# Altium footprint library MainFPs.PcbLib: 206 footprints (part 11 of 13)
Each footprint in its own frame and in the unit in brackets; x right, y up, seen from the top. Pads: shape width x height; smd on the part's side, far side on the other; paste and mask are expansions set on the pad; w line width, h text height; cw(c..) or ccw(c..) is an arc to the next point about the centre after c.
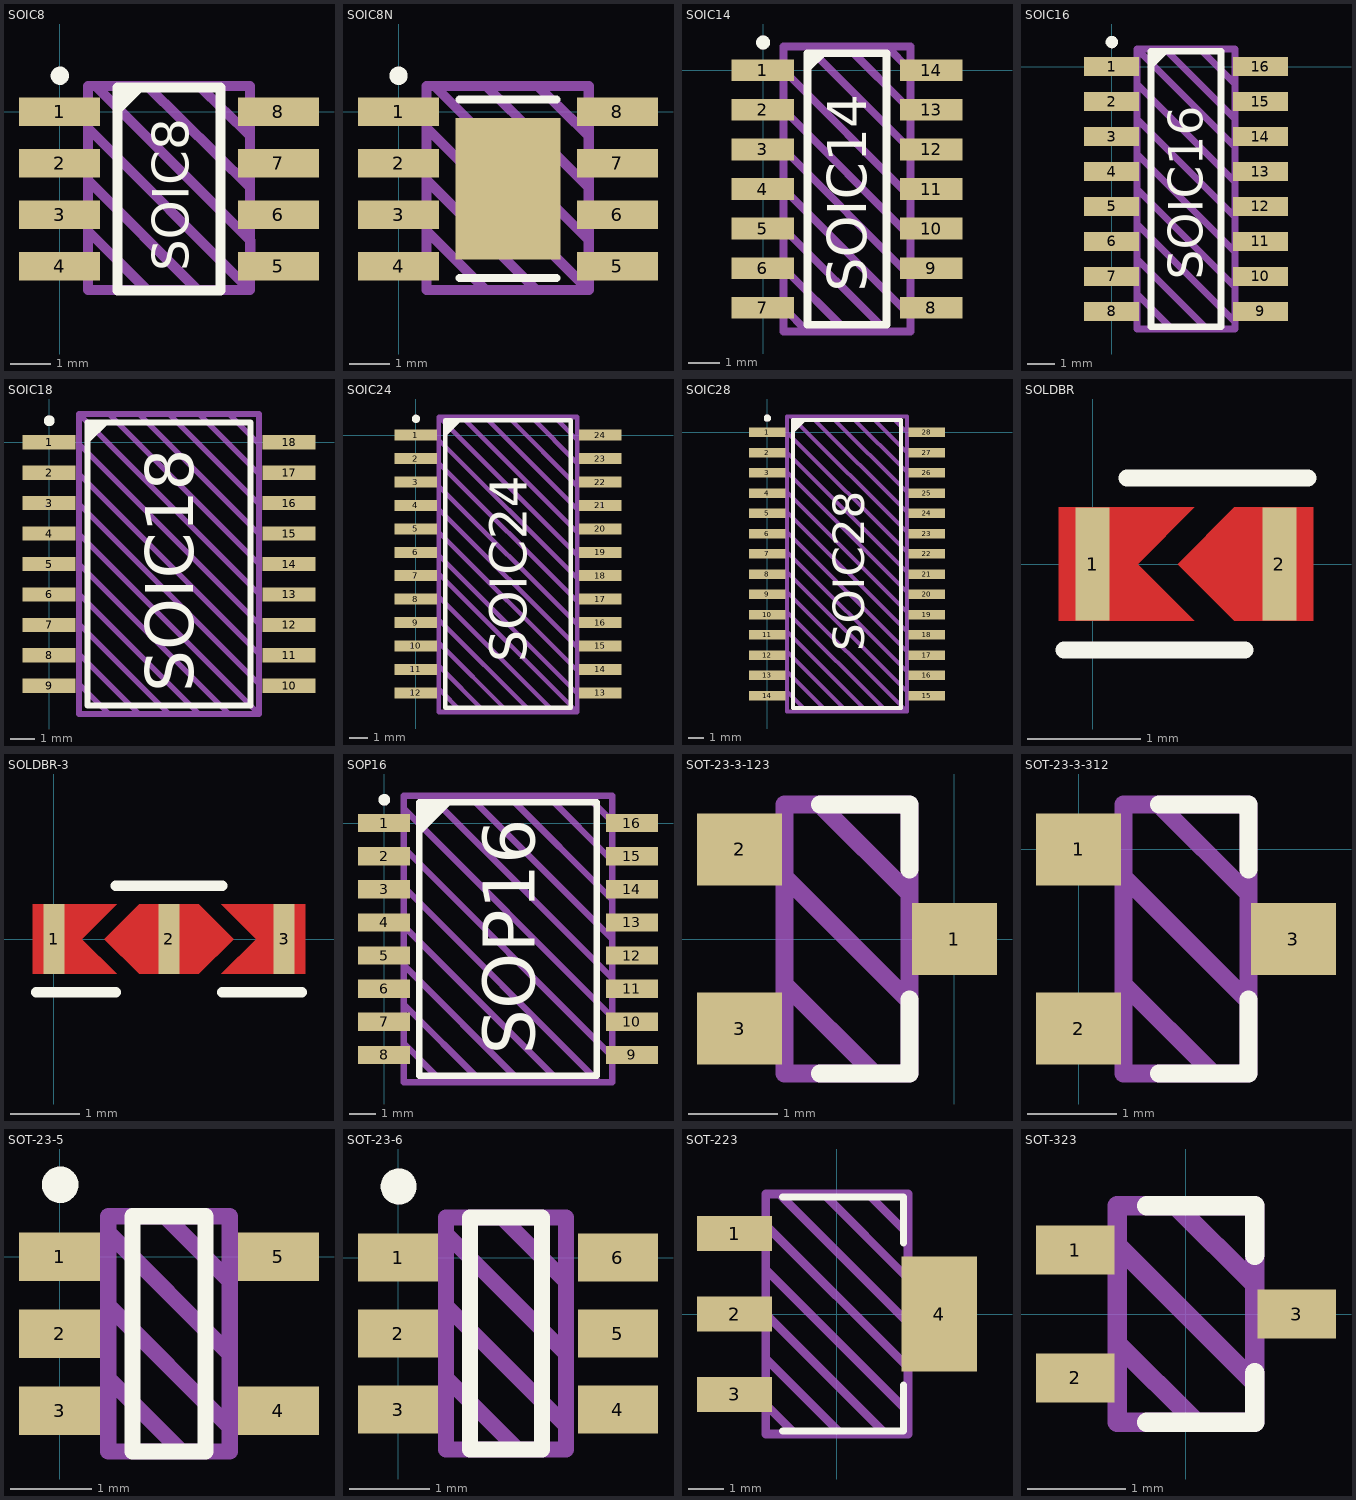
[diagram p10: the footprints below, top view; thin cyan lines are the x and y axes]

## SOIC8 [mm]
pads (8):
  rect 2x0.7 smd: 1(-0.008,0) 2(-0.008,-1.27) 3(-0.008,-2.54) 4(-0.008,-3.81) 5(5.392,-3.81) 6(5.392,-2.54) 7(5.392,-1.27) 8(5.392,0)
Top Overlay:
  circle w0.25: c0,0.889 r0.1
  region: 1.422,0.595 1.422,-0.102 2.119,0.595
  lines w0.25: 1.763,0.595 1.778,0.595 ; 2.017,0.595 2.286,0.595 ; 1.422,-4.405 1.422,0.595 3.962,0.595 3.962,-4.405 1.422,-4.405
  text "SOIC8" at 3.175,-3.937 h0.9
Draw:
  lines w0.25: 0.692,-4.311 0.692,-4.146 ; 0.692,-2.876 0.692,-2.94 2.143,-4.391 ; 0.692,-1.606 0.692,-1.689 3.404,-4.4 ; 0.692,-0.4 4.692,-4.4 ; 0.692,0.635 0.692,-4.4 4.692,-4.4 ; 0.762,0.635 4.692,0.635 4.692,-4.4 ; 0.889,0.635 4.699,-3.175 4.699,-3.556 ; 2.159,0.635 4.692,-1.86 ; 3.429,0.635 4.692,-0.59
Info:
  text "'.Comment'" at -0.508,-5.461 h0.75
3D body "SOIC0.step": height 1.75, standoff 0, extent -0.308,-4.405 5.692,0.595

## SOIC8N [mm]
pads (9):
  rect 2x0.7 smd: 1(0,0) 2(0,-1.27) 3(0,-2.54) 4(0,-3.81) 5(5.4,-3.81) 6(5.4,-2.54) 7(5.4,-1.27) 8(5.4,0)
  rect 2.6x3.5 smd: ""(2.7,-1.9)
Top Overlay:
  circle w0.25: c0,0.889 r0.1
  lines w0.2: 1.499,-4.097 3.899,-4.097 ; 1.5,0.3 3.9,0.3
Draw:
  lines w0.25: 0.692,-4.311 0.692,-4.146 ; 0.692,-2.876 0.692,-2.94 2.143,-4.391 ; 0.692,-1.606 0.692,-1.689 3.404,-4.4 ; 0.692,-0.4 4.692,-4.4 ; 0.692,0.635 0.692,-4.4 4.692,-4.4 ; 0.762,0.635 4.692,0.635 4.692,-4.4 ; 0.889,0.635 4.699,-3.175 4.699,-3.556 ; 2.159,0.635 4.692,-1.86 ; 3.429,0.635 4.692,-0.59
Info:
  text "'.Comment'" at -0.508,-5.461 h0.75
3D body "SOIC0.step": height 1.75, standoff 0, extent -0.308,-4.405 5.692,0.595

## SOIC14 [mm]
height 1.75
pads (14):
  rect 2x0.7 smd: 1(-0.008,0) 2(-0.008,-1.27) 3(-0.008,-2.54) 4(-0.008,-3.81) 5(-0.008,-5.08) 6(-0.008,-6.35) 7(-0.008,-7.62) 8(5.392,-7.62) 9(5.392,-6.35) 10(5.392,-5.08) 11(5.392,-3.81) 12(5.392,-2.54) 13(5.392,-1.27) 14(5.392,0)
Top Overlay:
  circle w0.25: c0,0.889 r0.1
  region: 1.422,0.595 1.422,-0.102 2.119,0.595
  lines w0.25: 1.422,-8.16 3.962,-8.16 3.962,0.54 1.422,0.54 1.422,-8.16
  text "SOIC14" at 3.302,-7.112 h1.25
Draw:
  lines w0.25: 0.66,-7.62 1.422,-8.382 ; 0.66,-6.35 2.692,-8.382 1.422,-8.382 ; 0.66,0 4.724,-4.064 4.724,-5.08 4.724,-3.81 ; 1.422,0.762 4.724,-2.54 ; 2.692,0.762 4.724,-1.27 ; 3.962,0.762 4.724,0 ; 4.724,-6.35 4.724,-5.334 0.66,-1.27 0.66,-2.54 4.724,-6.604 4.724,-8.382 ; 1.422,-8.382 3.962,-8.382 0.66,-5.08 0.66,-3.81 4.724,-7.874 4.724,-8.382 ; 4.724,-8.382 4.724,0.762 0.66,0.762 0.66,-8.382 4.724,-8.382
Info:
  text "'.Comment'" at -0.508,-9.398 h0.75
3D body "SOIC16(T).step": height 1.75, standoff 0, extent -0.308,-8.16 5.692,0.54

## SOIC16 [mm]
height 1.75
pads (16):
  rect 2x0.7 smd: 1(-0.008,0) 2(-0.008,-1.27) 3(-0.008,-2.54) 4(-0.008,-3.81) 5(-0.008,-5.08) 6(-0.008,-6.35) 7(-0.008,-7.62) 8(-0.008,-8.89) 9(5.392,-8.89) 10(5.392,-7.62) 11(5.392,-6.35) 12(5.392,-5.08) 13(5.392,-3.81) 14(5.392,-2.54) 15(5.392,-1.27) 16(5.392,0)
Top Overlay:
  circle w0.25: c0,0.889 r0.1
  region: 1.422,0.595 1.422,-0.102 2.119,0.595
  lines w0.25: 1.596,0.555 1.93,0.555 ; 1.85,0.555 2.184,0.555 ; 2.104,0.555 2.692,0.555 ; 1.422,-9.445 3.962,-9.445 3.962,0.555 1.422,0.555 1.422,-9.445
  text "SOIC16" at 3.302,-7.747 h1.25
Draw:
  lines w0.25: 0.914,-8.255 2.184,-9.525 ; 0.914,-6.985 3.454,-9.525 3.962,-9.525 ; 0.914,-5.715 4.47,-9.271 ; 0.914,-4.445 4.47,-8.001 4.47,-8.255 4.47,-6.731 0.914,-3.175 ; 0.914,-1.905 4.47,-5.461 4.47,-5.715 ; 0.914,-0.635 4.47,-4.191 ; 1.422,0.635 1.93,0.635 4.47,-1.905 ; 2.184,0.635 3.2,0.635 4.47,-0.635 ; 4.47,-4.445 4.47,-4.191 ; 0.914,0.635 0.914,-9.525 4.47,-9.525 4.47,0.635 0.914,0.635 ; 0.914,0.635 4.47,-2.921 4.47,-4.191
Info:
  text "'.Comment'" at -0.254,-10.541 h0.75
3D body "SOIC16.step": height 1.75, standoff 0, extent -0.308,-9.445 5.692,0.555

## SOIC18 [mm]
height 2.5
pads (18):
  rect 2.2x0.6 smd: 1(0,0) 2(0,-1.27) 3(0,-2.54) 4(0,-3.81) 5(0,-5.08) 6(0,-6.35) 7(0,-7.62) 8(0,-8.89) 9(0,-10.16) 10(10,-10.16) 11(10,-8.89) 12(10,-7.62) 13(10,-6.35) 14(10,-5.08) 15(10,-3.81) 16(10,-2.54) 17(10,-1.27) 18(10,0)
Top Overlay:
  circle w0.25: c0.008,0.889 r0.1
  region: 1.604,0.856 1.604,-0.094 2.554,0.856
  lines w0.25: 1.6,-10.98 8.4,-10.98 8.4,0.82 1.6,0.82 1.6,-10.98
  text "SOIC18" at 6.016,-10.414 h2
Draw:
  lines w0.25: 1.25,-10.08 2.5,-11.33 ; 1.25,-8.83 3.75,-11.33 ; 1.25,-7.58 5,-11.33 ; 1.25,-6.33 6.25,-11.33 ; 1.25,-5.08 7.5,-11.33 ; 1.25,-3.83 8.75,-11.33 ; 1.25,-2.58 8.75,-10.08 8.75,-8.83 1.25,-1.33 ; 1.25,-0.08 8.75,-7.58 ; 2.25,1.17 2.5,1.17 8.75,-5.08 ; 3.75,1.17 8.75,-3.83 8.75,-4.58 ; 4.75,1.17 5,1.17 8.75,-2.58 ; 6.25,1.17 8.75,-1.33 8.75,-2.33 ; 7.5,1.17 8.75,-0.08 ; 8.75,-6.58 8.75,-6.33 1.25,1.17 ; 1.25,1.17 8.75,1.17 8.75,-11.33 ; 1.25,1.17 1.25,-11.33 8.75,-11.33
Info:
  text "'.Comment'" at 0.047,-12.7 h1
3D body "SOIC18.step": height 2.5, standoff 0, extent -0.208,-10.98 10.208,0.82

## SOIC24 [mm]
height 2.5
pads (24):
  rect 2.3x0.6 smd: 1(0,0) 2(0,-1.27) 3(0,-2.54) 4(0,-3.81) 5(0,-5.08) 6(0,-6.35) 7(0,-7.62) 8(0,-8.89) 9(0,-10.16) 10(0,-11.43) 11(0,-12.7) 12(0,-13.97) 13(10,-13.97) 14(10,-12.7) 15(10,-11.43) 16(10,-10.16) 17(10,-8.89) 18(10,-7.62) 19(10,-6.35) 20(10,-5.08) 21(10,-3.81) 22(10,-2.54) 23(10,-1.27) 24(10,0)
Top Overlay:
  circle w0.25: c0.008,0.889 r0.1
  region: 1.604,0.856 1.604,-0.094 2.554,0.856
  lines w0.25: 1.6,-14.785 1.6,0.815 8.4,0.815 8.4,-14.785 1.6,-14.785
  text "SOIC24" at 6.016,-12.319 h2
Draw:
  lines w0.25: 1.25,-13.76 2.5,-15.01 2.75,-15.01 ; 1.25,-12.51 3.75,-15.01 ; 1.25,-11.26 5,-15.01 ; 1.25,-10.01 6.25,-15.01 ; 1.25,-8.76 7.5,-15.01 ; 1.25,-7.51 8.75,-15.01 ; 1.25,-6.51 8.75,-14.01 ; 1.25,-5.26 8.75,-12.76 ; 1.25,-4.01 8.75,-11.51 ; 1.25,-2.76 8.75,-10.26 ; 1.25,-1.26 1.25,-1.51 8.75,-9.01 ; 1.25,-0.01 1.25,-0.26 8.75,-7.76 ; 2.5,0.99 8.75,-5.26 ; 3.75,0.99 8.75,-4.01 ; 5,0.99 8.75,-2.76 ; 6.25,0.99 8.75,-1.51 ; 7.5,0.99 8.75,-0.26 ; 8.75,-6.51 1.25,0.99 ; 1.25,0.99 1.25,-15.01 8.75,-15.01 ; 1.25,0.99 4.5,0.99 8.75,0.99 8.75,-15.01
Info:
  text "'.Comment'" at 0.047,-16.38 h1
3D body "SOIC24.step": height 2.5, standoff 0, extent -0.208,-14.8 10.208,0.8

## SOIC28 [mm]
pads (28):
  rect 2.3x0.6 smd: 1(0,0) 2(0,-1.27) 3(0,-2.54) 4(0,-3.81) 5(0,-5.08) 6(0,-6.35) 7(0,-7.62) 8(0,-8.89) 9(0,-10.16) 10(0,-11.43) 11(0,-12.7) 12(0,-13.97) 13(0,-15.24) 14(0,-16.51) 15(10,-16.51) 16(10,-15.24) 17(10,-13.97) 18(10,-12.7) 19(10,-11.43) 20(10,-10.16) 21(10,-8.89) 22(10,-7.62) 23(10,-6.35) 24(10,-5.08) 25(10,-3.81) 26(10,-2.54) 27(10,-1.27) 28(10,0)
Top Overlay:
  circle w0.25: c0.008,0.889 r0.1
  region: 1.604,0.856 1.604,-0.094 2.554,0.856
  lines w0.25: 1.6,-17.272 1.6,0.762 8.4,0.762 8.4,-17.272 1.6,-17.272
  text "SOIC28" at 6.096,-13.716 h2
Draw:
  lines w0.25: 1.25,-16.25 2.5,-17.5 2.75,-17.5 ; 1.25,-15 3.75,-17.5 ; 1.25,-13.75 5,-17.5 ; 1.25,-12.5 6.25,-17.5 ; 1.25,-11.25 7.5,-17.5 ; 1.25,-10 8.75,-17.5 ; 1.25,-8.75 8.75,-16.25 ; 1.25,-7.5 8.75,-15 ; 1.25,-6.25 8.75,-13.75 ; 1.25,-5 8.75,-12.5 ; 1.25,-3.75 8.75,-11.25 ; 1.25,-2.5 8.75,-10 ; 1.25,-1.25 8.75,-8.75 ; 1.25,0 8.75,-7.5 ; 1.5,1 8.75,-6.25 8.75,-7 ; 2.75,1 8.75,-5 8.75,-5.25 ; 3.5,1 4,1 8.75,-3.75 ; 4.75,1 5.25,1 8.75,-2.5 ; 5.5,1 6.5,1 8.75,-1.25 ; 7,1 7.75,1 8.75,0 ; 8.75,-17.5 8.75,1 1.25,1 1.25,-17.25 1.25,-17.5 8.75,-17.5
Info:
  text "'.Comment'" at 0.047,-18.87 h1
3D body "SOIC281.step": height 2.1, standoff 0, extent -0.208,-17.205 10.208,0.695

## SOLDBR [mm]
pads (2):
  rect 0.3x1 smd: 1(0,0) 2(1.651,0)
Top Layer:
  region: -0.3,0.5 0.9,0.5 0.4,0 0.9,-0.5 -0.3,-0.5
  region: 1.951,0.5 1.251,0.5 0.751,0 1.251,-0.5 1.951,-0.5
Top Overlay:
  lines w0.15: -0.254,-0.762 1.346,-0.762 ; 0.305,0.762 1.905,0.762

## SOLDBR-3 [mm]
pads (3):
  rect 0.3x1 smd: 1(0,0) 2(1.651,0) 3(3.302,0)
Top Layer:
  region: 1.651,0.5 2.076,0.5 2.576,0 2.076,-0.5 1.651,-0.5
  region: -0.3,0.5 0.9,0.5 0.4,0 0.9,-0.5 -0.3,-0.5
  region: 3.602,-0.5 2.402,-0.5 2.902,0 2.402,0.5 3.602,0.5
  region: 1.651,0.5 1.226,0.5 0.726,0 1.226,-0.5 1.651,-0.5
Top Overlay:
  lines w0.15: -0.254,-0.762 0.889,-0.762 ; 0.889,0.762 2.413,0.762 ; 2.413,-0.762 3.556,-0.762

## SOP16 [mm]
height 2.5
pads (16):
  rect 2x0.7 smd: 1(0,0) 2(0,-1.27) 3(0,-2.54) 4(0,-3.81) 5(0,-5.08) 6(0,-6.35) 7(0,-7.62) 8(0,-8.89) 9(9.5,-8.89) 10(9.5,-7.62) 11(9.5,-6.35) 12(9.5,-5.08) 13(9.5,-3.81) 14(9.5,-2.54) 15(9.5,-1.27) 16(9.5,0)
Top Overlay:
  circle w0.25: c0.008,0.889 r0.1
  region: 1.35,0.805 2.634,0.805 1.35,-0.479
  lines w0.25: 1.35,-9.695 1.35,0.805 8.15,0.805 8.15,-9.695 1.35,-9.695
  text "SOP16" at 5.766,-8.89 h2
Draw:
  lines w0.25: 0.75,-8.445 2.25,-9.945 2.75,-9.945 ; 0.75,-6.945 3.75,-9.945 4.75,-9.945 ; 0.75,-5.445 5.25,-9.945 6.75,-9.945 ; 0.75,-3.945 6.75,-9.945 ; 0.75,-2.445 8.25,-9.945 8.75,-9.945 ; 0.75,-0.945 8.75,-8.945 ; 0.75,0.555 8.75,-7.445 8.75,-7.945 ; 1.75,1.055 8.75,-5.945 8.75,-6.945 ; 2.25,1.055 3.25,1.055 8.75,-4.445 ; 4.75,1.055 8.75,-2.945 ; 6.25,1.055 8.75,-1.445 8.75,-2.445 ; 7.25,-9.945 6.75,-9.945 ; 7.75,1.055 8.75,0.055 8.75,-0.445 ; 8.75,-9.945 8.75,1.055 0.75,1.055 0.75,-9.945 8.75,-9.945 ; 8.75,-8.945 8.75,-8.945
Info:
  text "'.Comment'" at -0.584,-11.557 h1.25
3D body "SOP16.step": height 2.5, standoff 0, extent -0.425,-9.695 9.925,0.805

## SOT-23-3-123 [mm]
pads (3):
  rect 0.95x0.8 smd: 1(0,0) 2(-2.4,1) 3(-2.4,-1)
Top Overlay:
  lines w0.2: -1.5,-1.5 -0.5,-1.5 -0.5,-0.676 ; -1.5,1.5 -0.5,1.5 -0.5,0.776
Draw:
  lines w0.2: -1.9,-0.5 -0.9,-1.5 ; -1.9,0.7 -0.5,-0.7 ; -1.5,1.5 -0.5,0.5 ; -1.9,-1.5 -1.9,1.5 -0.5,1.5 -0.5,-1.5 -1.9,-1.5
Info:
  text "'.Comment'" at -2.724,-2.286 h0.5
3D body "SOT-23.step": height 1.15, standoff 0, extent -2.5,-1.5 0.1,1.5

## SOT-23-3-312 [mm]
height 1.15
pads (3):
  rect 0.95x0.8 smd: 1(0,0) 2(0,-2) 3(2.4,-1)
Top Overlay:
  lines w0.2: 0.9,-2.5 1.9,-2.5 1.9,-1.676 ; 0.9,0.5 1.9,0.5 1.9,-0.224
Draw:
  lines w0.2: 0.5,-1.5 1.5,-2.5 ; 0.5,-0.3 1.9,-1.7 ; 0.9,0.5 1.9,-0.5 ; 0.5,-2.5 1.9,-2.5 1.9,0.5 0.5,0.5 0.5,-2.5
Info:
  text "'.Comment'" at -0.324,-3.286 h0.5
3D body "SOT-23.step": height 1.15, standoff 0, extent -0.1,-2.5 2.5,0.5

## SOT-23-5 [mm]
height 1.2
pads (5):
  rect 1x0.6 smd: 1(0,0) 2(0,-0.95) 3(0,-1.9) 4(2.7,-1.9) 5(2.7,0)
Top Overlay:
  circle w0.25: c0.008,0.889 r0.1
  lines w0.2: 0.9,-2.4 1.8,-2.4 1.8,0.5 0.9,0.5 0.9,-2.4
Draw:
  lines w0.2: 0.6,-1.5 1.5,-2.4 ; 0.6,-0.6 2.1,-2.1 ; 0.6,0.3 2.1,-1.2 ; 1.3,0.5 2.1,-0.3 ; 0.6,-2.4 2.1,-2.4 2.1,0.5 0.6,0.5 0.6,-2.4
Info:
  text "'.Comment'" at -1.066,-3.242 h0.5
3D body "SOT23-5.step": height 1.2, standoff 0, extent -0.15,-2.45 2.85,0.55

## SOT-23-6 [mm]
height 1.1
pads (6):
  rect 1x0.6 smd: 1(0,0) 2(0,-0.95) 3(0,-1.9) 4(2.75,-1.9) 5(2.75,-0.95) 6(2.75,0)
Top Overlay:
  circle w0.25: c0.008,0.889 r0.1
  lines w0.2: 0.9,-2.4 1.8,-2.4 1.8,0.5 0.9,0.5 0.9,-2.4
Draw:
  lines w0.2: 0.6,-1.5 1.5,-2.4 ; 0.6,-0.6 2.1,-2.1 ; 0.6,0.3 2.1,-1.2 ; 1.3,0.5 2.1,-0.3 ; 0.6,-2.4 2.1,-2.4 2.1,0.5 0.6,0.5 0.6,-2.4
Info:
  text "'.Comment'" at -1.016,-3.192 h0.5
3D body "SOT95P280X110-6N.step": height 1.1, standoff 0, extent -0.125,-2.475 2.875,0.575

## SOT-223 [mm]
height 1.7
pads (4):
  rect 2.15x1 smd: 1(-2.925,2.3) 2(-2.925,0) 3(-2.925,-2.3)
  rect 2.15x3.3 smd: 4(2.925,0)
Top Overlay:
  lines w0.2: -1.55,-3.35 1.55,-3.35 1.905,-3.35 1.905,-2.032 ; -1.55,3.35 1.55,3.35 1.905,3.35 1.905,2.032
Draw:
  lines w0.25: -2.032,-2.54 -2.032,-2.588 -1.27,-3.35 ; -2.032,-1.27 0.127,-3.429 0.635,-3.429 ; -2.032,0 1.397,-3.429 2.032,-3.429 ; -2.032,1.27 2.032,-2.794 ; -2.032,2.54 2.032,-1.524 2.032,-1.905 ; -0.762,3.429 -0.381,3.429 2.032,1.016 ; 0.762,3.429 0.889,3.429 2.032,2.286 ; 2.032,-3.111 2.032,-2.794 ; 2.032,-0.254 -1.651,3.429 -2.032,3.429 ; -2.032,3.429 2.032,3.429 2.032,-2.794 ; -2.032,3.429 -2.032,-3.429 2.032,-3.429 ; 2.032,-3.429 2.032,-2.794
Info:
  text "'.Comment'" at -3.556,-4.826 h1
3D body "SOT223.step": height 1.7, standoff 0, extent -3.5,-3.35 3.5,3.35

## SOT-323 [mm] "SC-70"
pads (3):
  rect 0.8x0.5 smd: 1(-1.125,0.65) 2(-1.125,-0.65) 3(1.125,0)
Top Overlay:
  lines w0.2: -0.4,-1.1 0.7,-1.1 0.7,-0.6 ; -0.4,1.1 0.7,1.1 0.7,0.6
Draw:
  lines w0.2: -0.7,-0.3 0.1,-1.1 ; -0.7,0.7 0.7,-0.7 ; -0.1,1.1 0.7,0.3 ; -0.7,-1.1 0.7,-1.1 0.7,1.1 -0.7,1.1 -0.7,-1.1
3D body "SOT65P235X100-3N.step": height 1, standoff 0, extent -1.2,-1.05 1.2,1.05